# Altium footprint library AMA4B_adapter_board.PcbLib: 84 footprints (part 2 of 6)
Each footprint in its own frame and in the unit in brackets; x right, y up, seen from the top. Pads: shape width x height; smd on the part's side, far side on the other; paste and mask are expansions set on the pad; w line width, h text height; cw(c..) or ccw(c..) is an arc to the next point about the centre after c.
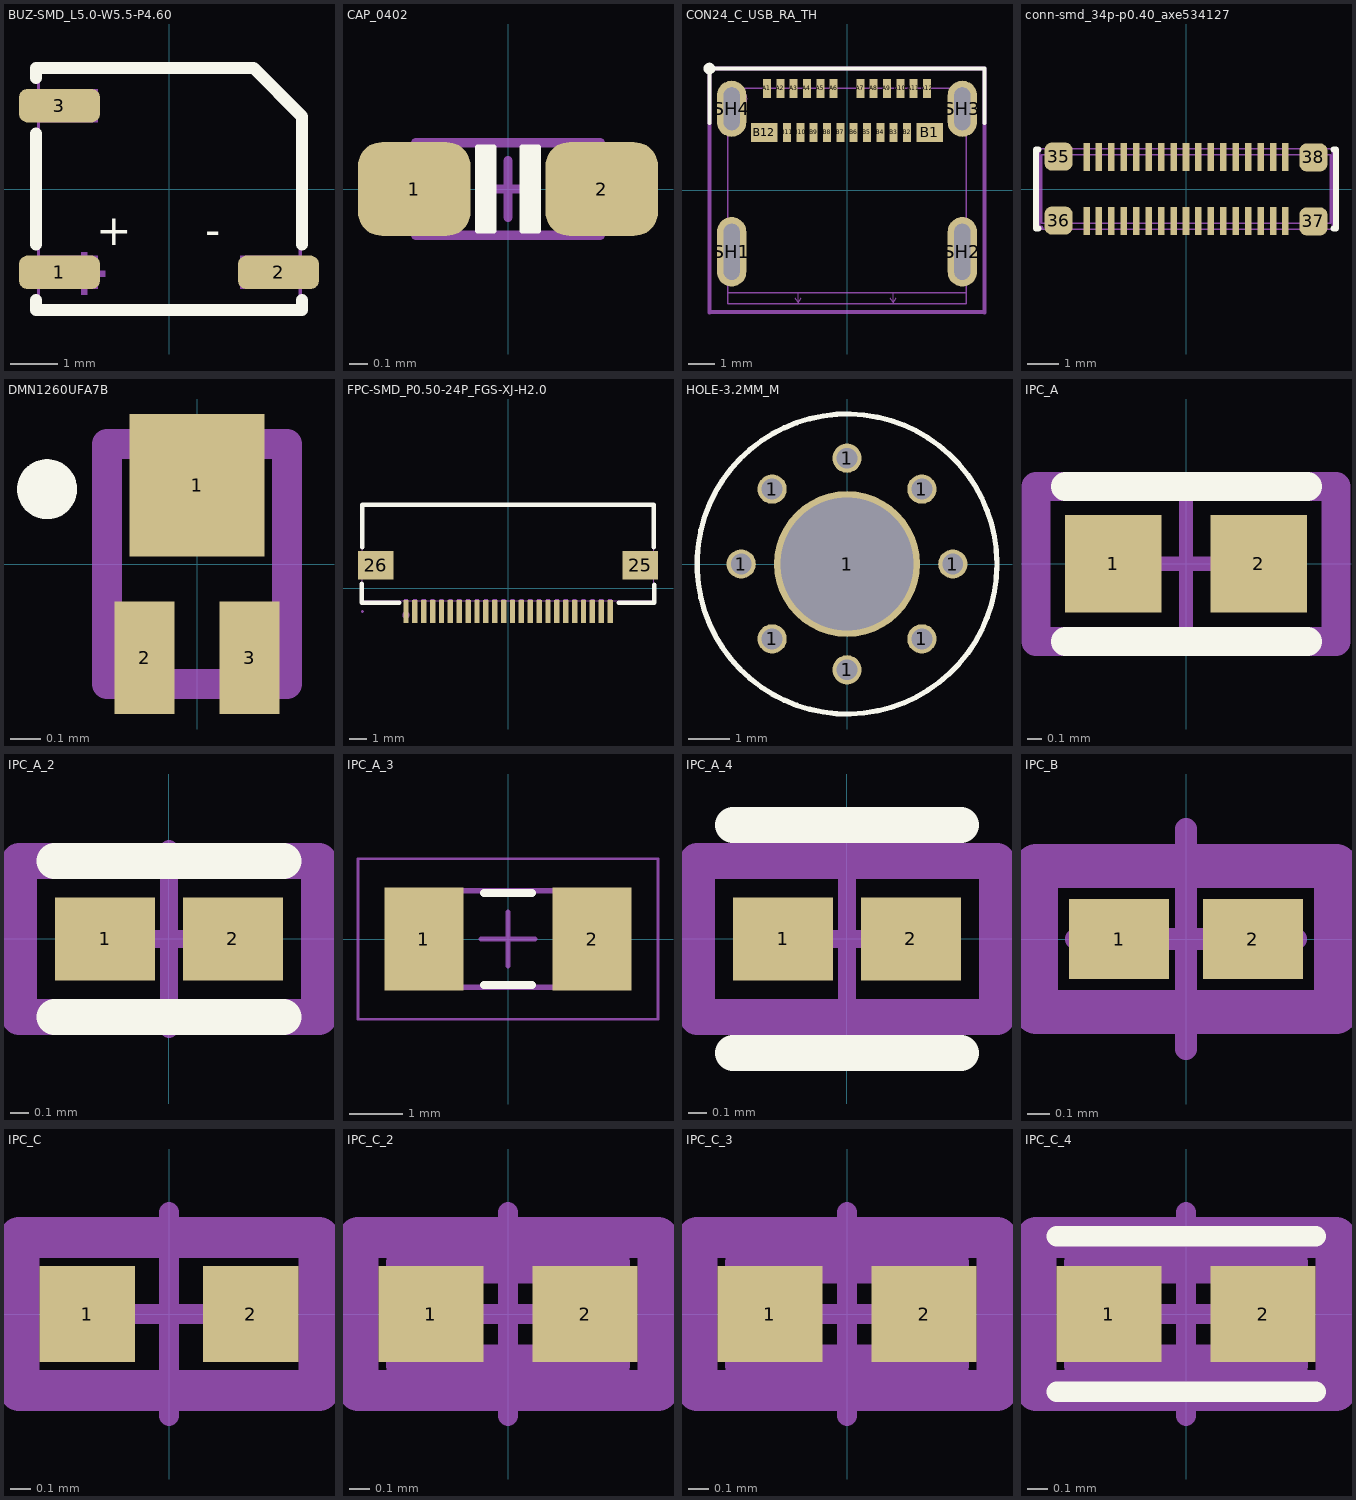
[diagram p1: the footprints below, top view; thin cyan lines are the x and y axes]

## BUZ-SMD_L5.0-W5.5-P4.60 [mm]
pads (3):
  rrect50% 1.7x0.7 smd paste+0 mask+0.051: 1(-2.3,-1.75) 2(2.3,-1.75) 3(-2.3,1.75)
Top Overlay:
  lines w0.254: -2.794,-2.331 -2.794,-2.54 2.793,-2.54 2.793,-2.332 ; -2.794,-1.169 -2.794,1.169 ; -2.794,2.331 -2.794,2.54 1.778,2.54 2.794,1.524 2.794,-1.169
  text "-" at 0.762,-1.177 h0.65
  text "+" at -1.524,-1.177 h0.65
Top Assembly:
  region: 1.587,-1.714 2.476,-1.714 2.476,-1.841 1.587,-1.841
  region: -1.841,-2.222 -1.841,-1.841 -2.222,-1.841 -2.222,-1.714 -1.841,-1.714 -1.841,-1.333 -1.714,-1.333 -1.714,-1.714 -1.333,-1.714 -1.333,-1.841 -1.714,-1.841 -1.714,-2.222
  lines w0.051: -2.75,-2.5 -2.75,2.5 1.7,2.5 2.75,1.5 2.75,-2.5 -2.75,-2.5
  text ".Designator" at -2.252,-0.226 h1
Top Courtyard:
  region: 1.5,-1.4 2.75,-1.4 2.75,-2.1 1.5,-2.1
  region: -2.75,-1.4 -1.5,-1.4 -1.5,-2.1 -2.75,-2.1
  region: -2.75,2.1 -1.5,2.1 -1.5,1.4 -2.75,1.4
  region: -2.81,-2.5 -2.81,-2.525 -2.775,-2.56 -2.725,-2.56 -2.69,-2.525 -2.69,-2.5 -2.69,-2.475 -2.725,-2.44 -2.775,-2.44 -2.81,-2.475 -2.81,-2.5
  lines w0.051: -2.73,-2.495 2.77,-2.495 2.77,1.505 1.72,2.505 -2.73,2.505 -2.73,-2.495
3D body "USUp-BUZZER1.step": height 2.01, standoff 0, extent -2.6,-2.633 2.6,2.633

## CAP_0402 [mil]
height 21.65
pads (2):
  rrect50% 24x20 smd: 1(-20,0) 2(20,0)
Top Overlay:
  region: 6.5,-9 3,-9 3,9 6.5,9
  region: -6.5,9 -3,9 -3,-9 -6.5,-9
  lines w1: -6.5,-9 -6.5,9 -3,9 -3,-9 -6.5,-9 ; 3,-9 6.5,-9 6.5,9 3,9 3,-9
Board Shape:
  lines w2: -19.69,-9.84 19.68,-9.84 19.68,9.84 -19.69,9.84 -19.69,-9.84
  text ".Designator" at -44.34,-4.45 h19.68
Top Component Center:
  lines w2: -6,0 6,0 ; 0,-6 0,6
3D body "CAPC1005X05L.step": height 19.68, standoff 0, extent -19.68,-9.84 19.69,9.85

## CON24_C_USB_RA_TH [mm] "CON24_C_USB_RA_TH"
pads (28):
  rect 0.3x0.701 smd mask+0.051: A1(-3,3.813) A2(-2.499,3.813) A3(-2.002,3.813) A4(-1.501,3.813) A5(-1.001,3.813) A6(-0.5,3.813) A7(0.5,3.813) A8(1.001,3.813) A9(1.499,3.813) A10(1.999,3.813) A11(2.499,3.813) A12(3,3.813) B2(2.25,2.164) B3(1.75,2.164) B4(1.25,2.164) B5(0.749,2.164) B6(0.251,2.164) B7(-0.249,2.164) B8(-0.749,2.164) B9(-1.25,2.164) B10(-1.75,2.164) B11(-2.248,2.164)
  rect 1.001x0.701 smd mask+0.051: B1(3.099,2.164) B12(-3.099,2.164)
  oval 1.1x2.6 hole 0.6 slot 2.1 at 90 deg mask+0.051: SH1(-4.321,-2.306) SH2(4.321,-2.306)
  oval 1.1x2.1 hole 0.6 slot 1.6 at 90 deg mask+0.051: SH3(4.321,3.053) SH4(-4.321,3.053)
Top Overlay:
  circle w0.2: c-5.156,4.559 r0.119
  lines w0.152: -5.156,2.527 -5.156,4.559 5.156,4.559 5.156,2.527
Board Shape:
  circle w0.025: c-4.064,3.429 r0.32
  lines w0.025: -1.95,-4.034 -1.829,-4.216 ; -1.829,-3.884 -1.829,-4.216 ; -1.708,-4.035 -1.829,-4.216 ; 1.609,-4.03 1.731,-4.211 ; 1.731,-3.88 1.731,-4.211 ; 1.852,-4.031 1.731,-4.211
  lines w0.051: -4.47,-3.834 4.47,-3.834 ; -4.47,-4.257 4.47,-4.257 4.47,3.823 -4.47,3.823 -4.47,-4.257
  text ".Designator" at 0.063,-2.15 h1.02
  text "PCB EDGE" at -1.237,-4.231 h0.55
Top Courtyard:
  lines w0.152: -5.156,-4.585 -5.156,4.559 5.156,4.559 5.156,-4.585 ; -5.156,-4.559 5.156,-4.559
3D body "1054500101.stp": height 3.28, standoff -0.68, extent -4.466,-4.077 4.474,3.823

## conn-smd_34p-p0.40_axe534127 [mm]
pads (38):
  rect 0.21x0.9 smd: 1(-3.2,-1.03) 2(-2.8,-1.03) 3(-2.4,-1.03) 4(-2,-1.03) 5(-1.6,-1.03) 6(-1.2,-1.03) 7(-0.8,-1.03) 8(-0.4,-1.03) 9(0,-1.03) 10(0.4,-1.03) 11(0.8,-1.03) 12(1.2,-1.03) 13(1.6,-1.03) 14(2,-1.03) 15(2.4,-1.03) 16(2.8,-1.03) 17(3.2,-1.03) 18(3.2,1.03) 19(2.8,1.03) 20(2.4,1.03) 21(2,1.03) 22(1.6,1.03) 23(1.2,1.03) 24(0.8,1.03) 25(0.4,1.03) 26(0,1.03) 27(-0.4,1.03) 28(-0.8,1.03) 29(-1.2,1.03) 30(-1.6,1.03) 31(-2,1.03) 32(-2.4,1.03) 33(-2.8,1.03) 34(-3.2,1.03)
  rrect50% 0.9x0.9 smd: 35(-4.1,1.044) 36(-4.1,-1.016) 37(4.1,-1.044) 38(4.1,1.016)
Top Overlay:
  lines w0.2: -4.754,-1.27 -4.826,-1.27 -4.826,1.27 -4.754,1.27 ; 4.754,-1.27 4.826,-1.27 4.826,-1.016 4.826,1.27 4.754,1.27
Top Assembly:
  lines w0.05: -4.7,-1.3 -4.7,1.3 4.7,1.3 4.7,-1.3 -4.7,-1.3
  text ".Designator" at -2.252,-0.226 h1
Top Courtyard:
  drawing of 43 lines, arcs and shapes, not listed
3D body "USUp-CN2.step": height 0.77, standoff 0, extent -4.65,-1.25 4.65,1.25

## DMN1260UFA7B [mm]
pads (3):
  rect 0.45x0.475 smd: 1(0,0.263)
  rect 0.2x0.375 smd: 2(-0.175,-0.312) 3(0.175,-0.312)
Top Overlay:
  lines w0.1: -0.5,0.2 cw(c-0.5,0.25) -0.5,0.3 cw(c-0.5,0.25) -0.5,0.2
Top Assembly:
  lines w0.1: -0.3,-0.4 -0.3,0.4 0.3,0.4 0.3,-0.4 -0.3,-0.4
  text ".Designator" at -0.674,-0.068 h0.3
3D body "DMN1260UFA-7B.stp": height 0.35, standoff -0.01, extent -0.325,-0.431 0.325,0.425

## FPC-SMD_P0.50-24P_FGS-XJ-H2.0 [mm]
pads (26):
  rect 0.3x1.3 smd: 1(-5.748,-1.301) 2(-5.248,-1.301) 3(-4.748,-1.301) 4(-4.248,-1.301) 5(-3.748,-1.301) 6(-3.248,-1.301) 7(-2.748,-1.301) 8(-2.248,-1.301) 9(-1.748,-1.301) 10(-1.248,-1.301) 11(-0.748,-1.301) 12(-0.248,-1.301) 13(0.252,-1.301) 14(0.752,-1.301) 15(1.252,-1.301) 16(1.752,-1.301) 17(2.252,-1.301) 18(2.752,-1.301) 19(3.252,-1.301) 20(3.752,-1.301) 21(4.252,-1.301) 22(4.752,-1.301) 23(5.252,-1.301) 24(5.752,-1.301)
  rect 2x1.6 smd: 25(7.45,1.301) 26(-7.45,1.301)
Top Overlay:
  lines w0.254: -8.25,0.27 -8.25,-0.8 -6.129,-0.8 ; -8.199,2.332 -8.199,4.701 8.199,4.701 ; 6.25,-0.8 8.25,-0.8 8.25,0.2 ; 8.2,2.332 8.2,4.701
Mechanical 6:
  circle w0.2: c-5.75,-1.5 r0.1
Top Courtyard:
  region: 8.198,2.051 8.198,0.551 6.898,0.551 6.898,2.051
  region: -8.198,0.551 -8.198,2.051 -6.898,2.051 -6.898,0.551
  region: 5.653,-1.301 5.653,-0.601 5.853,-0.601 5.853,-1.301
  region: 5.152,-1.301 5.152,-0.601 5.352,-0.601 5.352,-1.301
  region: 4.652,-1.301 4.652,-0.601 4.852,-0.601 4.852,-1.301
  region: 4.152,-1.301 4.152,-0.601 4.352,-0.601 4.352,-1.301
  region: 3.652,-1.301 3.652,-0.601 3.852,-0.601 3.852,-1.301
  region: 3.152,-1.301 3.152,-0.601 3.352,-0.601 3.352,-1.301
  region: 2.652,-1.301 2.652,-0.601 2.852,-0.601 2.852,-1.301
  region: 2.153,-1.301 2.153,-0.601 2.353,-0.601 2.353,-1.301
  region: 1.152,-1.301 1.152,-0.601 1.352,-0.601 1.352,-1.301
  region: 1.652,-1.301 1.652,-0.601 1.852,-0.601 1.852,-1.301
  region: 0.652,-1.301 0.652,-0.601 0.852,-0.601 0.852,-1.301
  region: 0.152,-1.301 0.152,-0.601 0.352,-0.601 0.352,-1.301
  region: -0.347,-1.301 -0.347,-0.601 -0.147,-0.601 -0.147,-1.301
  region: -0.847,-1.301 -0.847,-0.601 -0.647,-0.601 -0.647,-1.301
  region: -1.348,-1.301 -1.348,-0.601 -1.148,-0.601 -1.148,-1.301
  region: -1.848,-1.301 -1.848,-0.601 -1.648,-0.601 -1.648,-1.301
  region: -2.347,-1.301 -2.347,-0.601 -2.147,-0.601 -2.147,-1.301
  region: -2.847,-1.301 -2.847,-0.601 -2.647,-0.601 -2.647,-1.301
  region: -3.348,-1.301 -3.348,-0.601 -3.148,-0.601 -3.148,-1.301
  region: -3.848,-1.301 -3.848,-0.601 -3.648,-0.601 -3.648,-1.301
  region: -4.348,-1.301 -4.348,-0.601 -4.148,-0.601 -4.148,-1.301
  region: -4.847,-1.301 -4.847,-0.601 -4.647,-0.601 -4.647,-1.301
  region: -5.347,-1.301 -5.347,-0.601 -5.147,-0.601 -5.147,-1.301
  region: -5.848,-1.301 -5.848,-0.601 -5.648,-0.601 -5.648,-1.301
  region: -8.14,-1.301 -8.14,-1.276 -8.175,-1.241 -8.225,-1.241 -8.26,-1.276 -8.26,-1.301 -8.26,-1.326 -8.225,-1.361 -8.175,-1.361 -8.14,-1.326 -8.14,-1.301
  lines w0.051: -8.2,-0.7 -8.2,4.7 8.2,4.7 8.2,-0.7 -8.2,-0.7
3D body "ysJV-FPC1.step": height 2.01, standoff 0, extent -8.1,-1.45 8.1,4.55

## HOLE-3.2MM_M [mm]
pads (9):
  round 0.7 hole 0.5: 1(-2.54,0) 1(-1.796,1.796) 1(-1.796,-1.796) 1(0,-2.54) 1(0,2.54) 1(1.796,-1.796) 1(1.796,1.796) 1(2.54,0)
  round 3.5 hole 3.2: 1(0,0)
Top Overlay:
  circle w0.127: c0,0 r3.6
Top Solder:
  circle w0.305: c0.01,-0.002 r1.645
  region: 3.31,-0.002 3.31,0.214 3.254,0.643 3.142,1.061 2.976,1.461 2.76,1.835 2.496,2.179 2.191,2.484 1.847,2.748 1.473,2.964 1.073,3.13 0.655,3.242 0.226,3.298 0.01,3.298 -0.206,3.298 -0.635,3.242 -1.053,3.13 -1.453,2.964 -1.827,2.748 -2.171,2.484 -2.476,2.179 -2.74,1.835 -2.956,1.461 -3.122,1.061 -3.234,0.643 -3.29,0.214 -3.29,-0.002 -3.29,-0.218 -3.234,-0.647 -3.122,-1.065 -2.956,-1.465 -2.74,-1.839 -2.476,-2.183 -2.171,-2.488 -1.827,-2.752 -1.453,-2.968 -1.053,-3.134 -0.635,-3.246 -0.206,-3.302 0.01,-3.302 0.226,-3.302 0.655,-3.246 1.073,-3.134 1.473,-2.968 1.847,-2.752 2.191,-2.488 2.496,-2.183 2.76,-1.839 2.976,-1.465 3.142,-1.065 3.254,-0.647 3.31,-0.218
Bottom Solder:
  circle w0.305: c-0.003,-0.001 r1.645
  region: 3.297,-0.001 3.297,0.215 3.241,0.644 3.129,1.062 2.963,1.462 2.747,1.836 2.483,2.18 2.178,2.485 1.834,2.749 1.46,2.965 1.06,3.131 0.642,3.243 0.213,3.299 -0.003,3.299 -0.219,3.299 -0.648,3.243 -1.066,3.131 -1.466,2.965 -1.84,2.749 -2.184,2.485 -2.489,2.18 -2.753,1.836 -2.969,1.462 -3.135,1.062 -3.247,0.644 -3.303,0.215 -3.303,-0.001 -3.303,-0.217 -3.247,-0.646 -3.135,-1.064 -2.969,-1.464 -2.753,-1.838 -2.489,-2.182 -2.184,-2.487 -1.84,-2.751 -1.466,-2.967 -1.066,-3.133 -0.648,-3.245 -0.219,-3.301 -0.003,-3.301 0.213,-3.301 0.642,-3.245 1.06,-3.133 1.46,-2.967 1.834,-2.751 2.178,-2.487 2.483,-2.182 2.747,-1.838 2.963,-1.464 3.129,-1.064 3.241,-0.646 3.297,-0.217

## IPC_A [mm]
pads (2):
  rect 0.668x0.672 smd mask+0.051: 1(-0.502,0) 2(0.502,0)
Top Overlay:
  lines w0.2: -0.834,-0.537 0.839,-0.537 ; -0.834,0.536 0.839,0.536
Top Assembly:
  lines w0.2: -1.036,-0.536 1.036,-0.536 1.036,0.536 -1.036,0.536 -1.036,-0.536
  text ".Designator" at -1.126,-0.113 h0.5
Top Courtyard:
  lines w0.2: -1.036,-0.536 1.036,-0.536 1.036,0.536 -1.036,0.536 -1.036,-0.536
Top Component Center:
  lines w0.1: -0.5,0 0.5,0 ; 0,-0.5 0,0.5
3D body: height 0.4, standoff 0, extent 0.275,-0.275 0.525,0.275
3D body: height 0.4, standoff 0, extent -0.525,-0.275 -0.275,0.275
3D body: height 0.4, standoff 0, extent -0.275,-0.275 0.275,0.275

## IPC_A_2 [mm]
pads (2):
  rect 0.554x0.463 smd mask+0.025: 1(-0.354,0) 2(0.354,0)
Top Overlay:
  lines w0.2: -0.635,-0.432 0.635,-0.432 ; -0.635,0.432 0.635,0.432
Board Shape:
  lines w0.2: -0.831,-0.431 0.831,-0.431 0.831,0.431 -0.831,0.431 -0.831,-0.431
  text ".Designator" at 2.152,-0.874 h1
Top Courtyard:
  lines w0.2: -0.831,-0.431 0.831,-0.431 0.831,0.431 -0.831,0.431 -0.831,-0.431
Top Component Center:
  lines w0.1: -0.5,0 0.5,0 ; 0,-0.5 0,0.5
3D body: height 0.33, standoff 0, extent 0.165,-0.165 0.315,0.165
3D body: height 0.33, standoff 0, extent -0.315,-0.165 -0.165,0.165
3D body: height 0.33, standoff 0, extent -0.165,-0.165 0.165,0.165

## IPC_A_3 [mm]
pads (2):
  rect 1.47x1.92 smd: 1(-1.57,0) 2(1.57,0)
Top Overlay:
  lines w0.152: -0.45,-0.86 0.45,-0.86 ; -0.45,0.86 0.45,0.86
Board Shape:
  lines w0.1: -1.75,-0.9 -1.75,0.9 1.75,0.9 1.75,-0.9 -1.75,-0.9
  text ".Designator" at -1.145,-0.115 h0.51
Top Courtyard:
  lines w0.05: -2.8,-1.5 -2.8,1.5 2.8,1.5 2.8,-1.5 -2.8,-1.5
Top Component Center:
  lines w0.1: -0.5,0 0.5,0 ; 0,-0.5 0,0.5
3D body "INDC3216X11M.step": height 1.1, standoff 0, extent -1.75,-0.9 1.75,0.9

## IPC_A_4 [mm]
pads (2):
  rect 0.554x0.463 smd mask+0.025: 1(-0.354,0) 2(0.354,0)
Top Overlay:
  lines w0.2: -0.631,-0.631 0.631,-0.631 ; -0.631,0.631 0.631,0.631
Board Shape:
  lines w0.2: -0.831,-0.431 -0.831,0.431 0.831,0.431 0.831,-0.431 -0.831,-0.431
  text ".Designator" at -0.713,0.975 h1
Top Courtyard:
  lines w0.2: -0.831,-0.431 -0.831,0.431 0.831,0.431 0.831,-0.431 -0.831,-0.431
Top Component Center:
  lines w0.1: -0.5,0 0.5,0 ; 0,-0.5 0,0.5
3D body: height 0.33, standoff 0, extent -0.165,-0.165 0.165,0.165
3D body: height 0.33, standoff 0, extent -0.315,-0.165 -0.165,0.165
3D body: height 0.33, standoff 0, extent 0.165,-0.165 0.315,0.165

## IPC_B [mm]
pads (2):
  rect 0.454x0.363 smd mask+0.025: 1(-0.304,0) 2(0.304,0)
Board Shape:
  lines w0.2: -0.681,-0.331 0.681,-0.331 0.681,0.331 -0.681,0.331 -0.681,-0.331
  text ".Designator" at 2.015,-0.698 h1
Top Courtyard:
  lines w0.2: -0.681,-0.331 0.681,-0.331 0.681,0.331 -0.681,0.331 -0.681,-0.331
Top Component Center:
  lines w0.1: -0.5,0 0.5,0 ; 0,-0.5 0,0.5
3D body: height 0.33, standoff 0, extent 0.165,-0.165 0.315,0.165
3D body: height 0.33, standoff 0, extent -0.315,-0.165 -0.165,0.165
3D body: height 0.33, standoff 0, extent -0.165,-0.165 0.165,0.165

## IPC_C [mm]
pads (2):
  rect 0.468x0.472 smd mask+0.051: 1(-0.402,0) 2(0.402,0)
Board Shape:
  lines w0.2: -0.736,-0.375 0.736,-0.375 0.736,0.375 -0.736,0.375 -0.736,-0.375
  text ".Designator" at -0.686,-1.159 h1
Top Courtyard:
  lines w0.2: -0.736,-0.375 0.736,-0.375 0.736,0.375 -0.736,0.375 -0.736,-0.375
Top Component Center:
  lines w0.1: -0.5,0 0.5,0 ; 0,-0.5 0,0.5
3D body: height 0.4, standoff 0, extent 0.275,-0.275 0.525,0.275
3D body: height 0.4, standoff 0, extent -0.525,-0.275 -0.275,0.275
3D body: height 0.4, standoff 0, extent -0.275,-0.275 0.275,0.275

## IPC_C_2 [mm]
pads (2):
  rect 0.515x0.472 smd mask+0.051: 1(-0.379,0) 2(0.379,0)
Board Shape:
  lines w0.2: -0.736,-0.375 -0.736,0.375 0.736,0.375 0.736,-0.375 -0.736,-0.375
  text ".Designator" at -2.227,-1.293 h1
Top 3D Body:
  lines w0.2: -0.5,-0.25 -0.5,0.25 0.5,0.25 0.5,-0.25 -0.5,-0.25
Top Courtyard:
  lines w0.2: -0.736,-0.375 -0.736,0.375 0.736,0.375 0.736,-0.375 -0.736,-0.375
Top Component Center:
  lines w0.1: -0.5,0 0.5,0 -0.5,0 ; 0,-0.5 0,0.5 0,-0.5
3D body "Cap_Samsung_CL05A105MP5NNNC_eec.STEP": height 0.55, standoff 0, extent -0.5,-0.25 0.5,0.25

## IPC_C_3 [mm]
pads (2):
  rect 0.515x0.472 smd mask+0.051: 1(-0.379,0) 2(0.379,0)
Board Shape:
  lines w0.2: -0.736,-0.375 -0.736,0.375 0.736,0.375 0.736,-0.375 -0.736,-0.375
  text ".Designator" at -0.558,-0.253 h1
Top 3D Body:
  lines w0.2: -0.5,-0.25 -0.5,0.25 0.5,0.25 0.5,-0.25 -0.5,-0.25
Top Courtyard:
  lines w0.2: -0.736,-0.375 -0.736,0.375 0.736,0.375 0.736,-0.375 -0.736,-0.375
Top Component Center:
  lines w0.1: -0.5,0 0.5,0 -0.5,0 ; 0,-0.5 0,0.5 0,-0.5
3D body "Cap_Samsung_CL05A105MP5NNNC_eec.STEP": height 0.55, standoff 0, extent -0.5,-0.25 0.5,0.25

## IPC_C_4 [mm]
pads (2):
  rect 0.515x0.472 smd paste+0 mask+0.05: 1(-0.379,0) 2(0.379,0)
Top Overlay:
  lines w0.102: -0.635,-0.381 0.637,-0.381 ; -0.635,0.381 0.637,0.381
Board Shape:
  lines w0.2: -0.736,-0.375 0.736,-0.375 0.736,0.375 -0.736,0.375 -0.736,-0.375
  text ".Designator" at 2.176,1.217 h1
Top 3D Body:
  lines w0.2: -0.5,-0.25 0.5,-0.25 0.5,0.25 -0.5,0.25 -0.5,-0.25
Top Courtyard:
  lines w0.2: -0.736,-0.375 0.736,-0.375 0.736,0.375 -0.736,0.375 -0.736,-0.375
Top Component Center:
  lines w0.1: -0.5,0 0.5,0 ; 0,-0.5 0,0.5
3D body "Ind_Murata_LQG15HN39NJ02D_eec.STEP": height 0.25, standoff 0, extent -0.736,-0.375 0.736,0.375